# Altium schematic symbol library microbuilder.SCHLIB: 530 symbols (part 1 of 7)
Pins are listed as number, name and electrical type; pins without a type are passive.

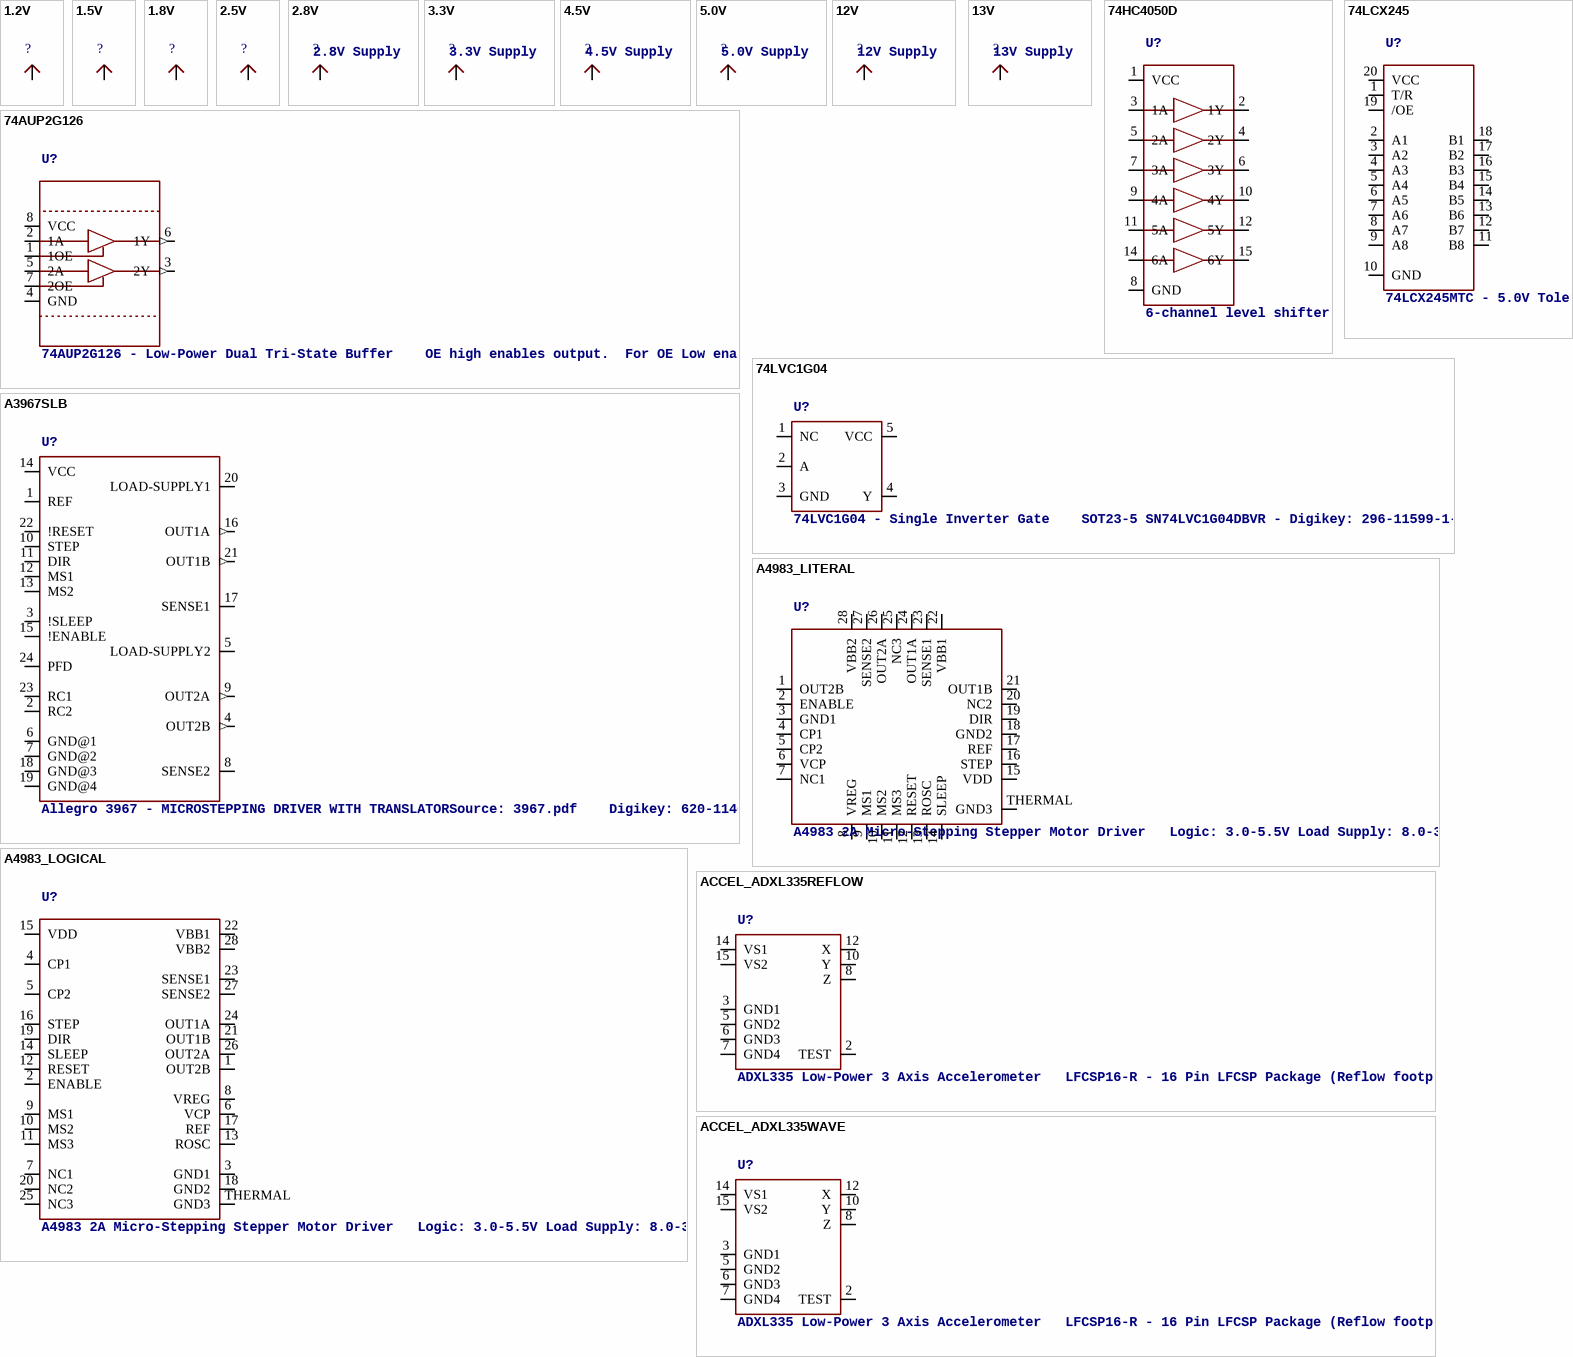
[diagram p0: symbols 1.2V to ACCEL_ADXL335WAVE]

## 1.2V
designator ?
pins: ?1 1.2V (oe)

## 1.5V
designator ?
pins: ?1 1.5V (oe)

## 1.8V
designator ?
pins: ?1 1.8V (oe)

## 2.5V
designator ?
pins: ?1 2.5V (oe)

## 2.8V
designator ?, comment 2.8V Supply
pins: ?1 2.8V (oe)

## 3.3V
designator ?, comment 3.3V Supply
pins: ?1 3.3V (oe)

## 4.5V
designator ?, comment 4.5V Supply
pins: ?1 4.5V (oe)

## 5.0V
designator ?, comment 5.0V Supply
pins: ?1 5.0V (oe)

## 12V
designator ?, comment 12V Supply
pins: ?1 12V (oe)

## 13V
designator ?, comment 13V Supply
pins: ?1 13V (oe)

## 74AUP2G126
designator U?, comment 74AUP2G126 - Low-Power Dual Tri-State Buffer    OE high enables output.  For OE Low enabled output use 74AUP2G125.    VCC: 0.8-3.6V  Temp: -40°C - 125°C       Package Variant: 8-VSSOP (SOT765-1)   Manuf. ID: 74AUP2G126DC,125   Digikey: 568-4987-1-ND   NOTE: Make sure to check the propogation delay to see if it's short enough for your timing since it's largely dependant on the line capacitance and supply voltage!
footprint VFSOP-8
pins: 1 1OE, 2 1A, 3 2Y (out), 4 GND (power), 5 2A, 6 1Y (out), 7 2OE, 8 VCC (power)

## 74HC4050D
designator U?, comment 6-channel level shifter    74HC4050D - 2V-6V Supply Digikey: 74HC4050D,653-ND  Mouser: 771-74HC4050D-T
footprint SOIC16
pins: 1 VCC, 2 1Y, 3 1A, 4 2Y, 5 2A, 6 3Y, 7 3A, 8 GND, 9 4A, 10 4Y, 11 5A, 12 5Y, 14 6A, 15 6Y

## 74LCX245
designator U?, comment 74LCX245MTC - 5.0V Tolerant Bi-Directional Buffer    Can be used to interface 5.0V logic to 2.5 or 3.3V devices Digikey: 74LCX245MTCXTR-ND  Mouser: 512-74LCX245MTCX
footprint TSSOP20
pins: 1 T/R, 2 A1, 3 A2, 4 A3, 5 A4, 6 A5, 7 A6, 8 A7, 9 A8, 10 GND, 11 B8, 12 B7, 13 B6, 14 B5, 15 B4, 16 B3, 17 B2, 18 B1, 19 /OE, 20 VCC

## 74LVC1G04
designator U?, comment 74LVC1G04 - Single Inverter Gate    SOT23-5 SN74LVC1G04DBVR - Digikey: 296-11599-1-ND
footprint SOT23-5
pins: 1 NC, 2 A, 3 GND (power), 4 Y, 5 VCC (power)

## A3967SLB
designator U?, comment Allegro 3967 - MICROSTEPPING DRIVER WITH TRANSLATORSource: 3967.pdf    Digikey: 620-1140-1-ND
footprint SOIC24WIDE
pins: 1 REF, 2 RC2, 3 !SLEEP, 4 OUT2B (out), 5 LOAD-SUPPLY2, 6 GND@1 (power), 7 GND@2 (power), 8 SENSE2, 9 OUT2A (out), 10 STEP, 11 DIR, 12 MS1, 13 MS2, 14 VCC (power), 15 !ENABLE, 16 OUT1A (out), 17 SENSE1, 18 GND@3 (power), 19 GND@4 (power), 20 LOAD-SUPPLY1, 21 OUT1B (out), 22 !RESET, 23 RC1, 24 PFD

## A4983_LITERAL
designator U?, comment A4983 2A Micro-Stepping Stepper Motor Driver   Logic: 3.0-5.5V Load Supply: 8.0-35V
footprint QFN28_5MM
pins: 1 OUT2B, 2 ENABLE, 3 GND1 (power), 4 CP1, 5 CP2, 6 VCP, 7 NC1, 8 VREG, 9 MS1, 10 MS2, 11 MS3, 12 RESET, 13 ROSC, 14 SLEEP, 15 VDD (power), 16 STEP, 17 REF, 18 GND2 (power), 19 DIR, 20 NC2, 21 OUT1B, 22 VBB1, 23 SENSE1, 24 OUT1A, 25 NC3, 26 OUT2A, 27 SENSE2, 28 VBB2, THERMAL GND3 (power)

## A4983_LOGICAL
designator U?, comment A4983 2A Micro-Stepping Stepper Motor Driver   Logic: 3.0-5.5V Load Supply: 8.0-35V
footprint QFN28_5MM
pins: 1 OUT2B, 2 ENABLE, 3 GND1 (power), 4 CP1, 5 CP2, 6 VCP, 7 NC1, 8 VREG, 9 MS1, 10 MS2, 11 MS3, 12 RESET, 13 ROSC, 14 SLEEP, 15 VDD (power), 16 STEP, 17 REF, 18 GND2 (power), 19 DIR, 20 NC2, 21 OUT1B, 22 VBB1, 23 SENSE1, 24 OUT1A, 25 NC3, 26 OUT2A, 27 SENSE2, 28 VBB2, THERMAL GND3 (power)

## ACCEL_ADXL335REFLOW
designator U?, comment ADXL335 Low-Power 3 Axis Accelerometer   LFCSP16-R - 16 Pin LFCSP Package (Reflow footprint) LFSCP16-W - 16 Pin LFCSP Package (Wave footprint with extended pads for hand soldering)    Digikey: ADXL335BCPZ-RL7CT-ND
footprint LFCSP16-R
pins: 2 TEST, 3 GND1, 5 GND2, 6 GND3, 7 GND4, 8 Z, 10 Y, 12 X, 14 VS1, 15 VS2

## ACCEL_ADXL335WAVE
designator U?, comment ADXL335 Low-Power 3 Axis Accelerometer   LFCSP16-R - 16 Pin LFCSP Package (Reflow footprint) LFSCP16-W - 16 Pin LFCSP Package (Wave footprint with extended pads for hand soldering)    Digikey: ADXL335BCPZ-RL7CT-ND
footprint LFCSP16-W
pins: 2 TEST, 3 GND1, 5 GND2, 6 GND3, 7 GND4, 8 Z, 10 Y, 12 X, 14 VS1, 15 VS2

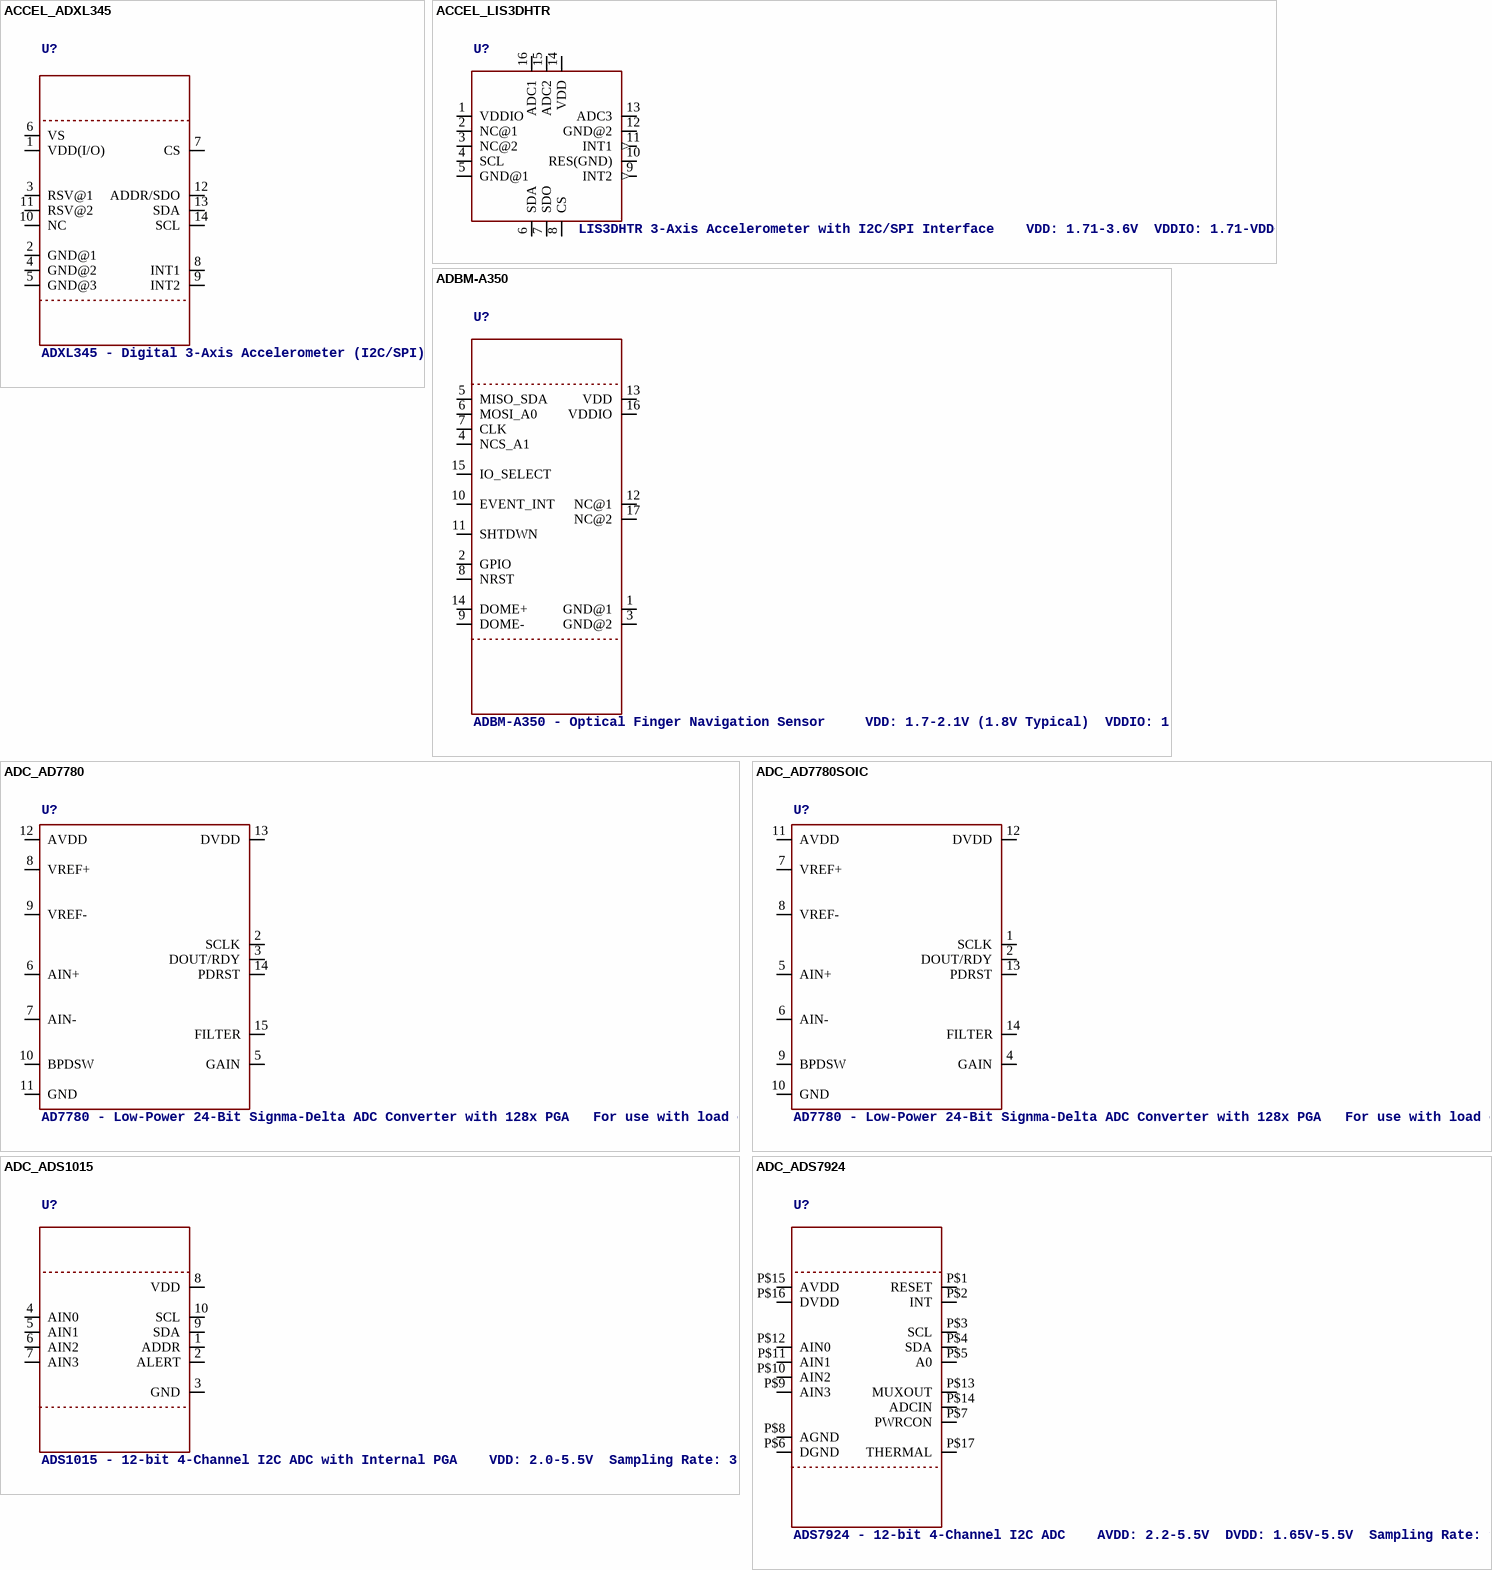
[diagram p1: symbols ACCEL_ADXL345 to ADC_ADS7924]

## ACCEL_ADXL345
designator U?, comment ADXL345 - Digital 3-Axis Accelerometer (I2C/SPI)
footprint LGA14
pins: 1 VDD(I/O), 2 GND@1, 3 RSV@1, 4 GND@2, 5 GND@3, 6 VS, 7 CS, 8 INT1, 9 INT2, 10 NC, 11 RSV@2, 12 ADDR/SDO, 13 SDA, 14 SCL

## ACCEL_LIS3DHTR
designator U?, comment LIS3DHTR 3-Axis Accelerometer with I2C/SPI Interface    VDD: 1.71-3.6V  VDDIO: 1.71-VDD+0.1V  Scale: +/-2g, 4g, 8g, 16g with 16--bit data output  Temp:: -40°C - 85°C       Mouser: 511-LIS3DHTR Digikey: 497-10613-1-ND
footprint LGA16_3X3MM
pins: 1 VDDIO (oe), 2 NC@1, 3 NC@2, 4 SCL, 5 GND@1 (oe), 6 SDA, 7 SDO, 8 CS, 9 INT2 (out), 10 RES(GND), 11 INT1 (out), 12 GND@2 (oe), 13 ADC3, 14 VDD (oe), 15 ADC2, 16 ADC1

## ADBM-A350
designator U?, comment ADBM-A350 - Optical Finger Navigation Sensor     VDD: 1.7-2.1V (1.8V Typical)  VDDIO: 1.65-3.6V (1.8V or 2.8V Typical)  Operating Temp: -20-70°C       FPC Connector: Hirose FH26-17S-0.3SHW(05)
footprint ADBM-A350
pins: 1 GND@1 (power), 2 GPIO, 3 GND@2 (power), 4 NCS_A1, 5 MISO_SDA, 6 MOSI_A0, 7 CLK, 8 NRST, 9 DOME-, 10 EVENT_INT, 11 SHTDWN, 12 NC@1, 13 VDD (power), 14 DOME+, 15 IO_SELECT, 16 VDDIO (power), 17 NC@2

## ADC_AD7780
designator U?, comment AD7780 - Low-Power 24-Bit Signma-Delta ADC Converter with 128x PGA   For use with load cells   TSSOP16 = 5.0x4.4mm package - Digikey: AD7780BRUZ-ND   SOIC14 = 8.70x3.9mm package - Digikey: AD7780BRZ-ND
footprint TSSOP16
pins: 2 SCLK, 3 DOUT/RDY, 5 GAIN, 6 AIN+, 7 AIN-, 8 VREF+, 9 VREF-, 10 BPDSW, 11 GND, 12 AVDD, 13 DVDD, 14 PDRST, 15 FILTER

## ADC_AD7780SOIC
designator U?, comment AD7780 - Low-Power 24-Bit Signma-Delta ADC Converter with 128x PGA   For use with load cells   TSSOP16 = 5.0x4.4mm package - Digikey: AD7780BRUZ-ND   SOIC14 = 8.70x3.9mm package - Digikey: AD7780BRZ-ND
footprint SOIC14
pins: 1 SCLK, 2 DOUT/RDY, 4 GAIN, 5 AIN+, 6 AIN-, 7 VREF+, 8 VREF-, 9 BPDSW, 10 GND, 11 AVDD, 12 DVDD, 13 PDRST, 14 FILTER

## ADC_ADS1015
designator U?, comment ADS1015 - 12-bit 4-Channel I2C ADC with Internal PGA    VDD: 2.0-5.5V  Sampling Rate: 3.3ksps  Gain Settings: 2/3, 1, 2, 4, 8, 16  I2C Address: ADDR low = 1001000x, ADDR high = 1001001x       Internal Comparator   The ADS1015 includes an internal comparator that can be set to output a high-level on ALERT when the conversion results exceeeds a pre-defined upper level, and will deassert itself when the level falls below a pre-defined lower threshold level. It can also be set to windowed mode where the ALERT pin will be asserted if the data exceeds the upper threshold or falls below the lower threshold.
footprint MSOP10
pins: 1 ADDR, 2 ALERT, 3 GND, 4 AIN0, 5 AIN1, 6 AIN2, 7 AIN3, 8 VDD, 9 SDA, 10 SCL

## ADC_ADS7924
designator U?, comment ADS7924 - 12-bit 4-Channel I2C ADC    AVDD: 2.2-5.5V  DVDD: 1.65V-5.5V  Sampling Rate: 100ksps  I2C Address: ADDR low = 1001000x, ADDR DVDD = 1001001x       Digital Threshold Comparators   The ADS794 is a relatively low-power device and can be useful in certain low-power scenarios since it can be configured to regularly check the voltage on the analog input pins, and throw an interrupt or pull an MCU out of reset when a specific condition is met.  Each of the four inputs has it's own programmable threshold level.  It could be used to monitor the input level of solar or other ambient energy sources, and when the level is sufficiently high, wakeup the MCU to perform read some sensor data, etc., or wait until a supercap is charged to a sufficiently high level before waking the MCU.
footprint WQFN16
pins: P$1 RESET, P$2 INT, P$3 SCL, P$4 SDA, P$5 A0, P$6 DGND, P$7 PWRCON, P$8 AGND, P$9 AIN3, P$10 AIN2, P$11 AIN1, P$12 AIN0, P$13 MUXOUT, P$14 ADCIN, P$15 AVDD, P$16 DVDD, P$17 THERMAL

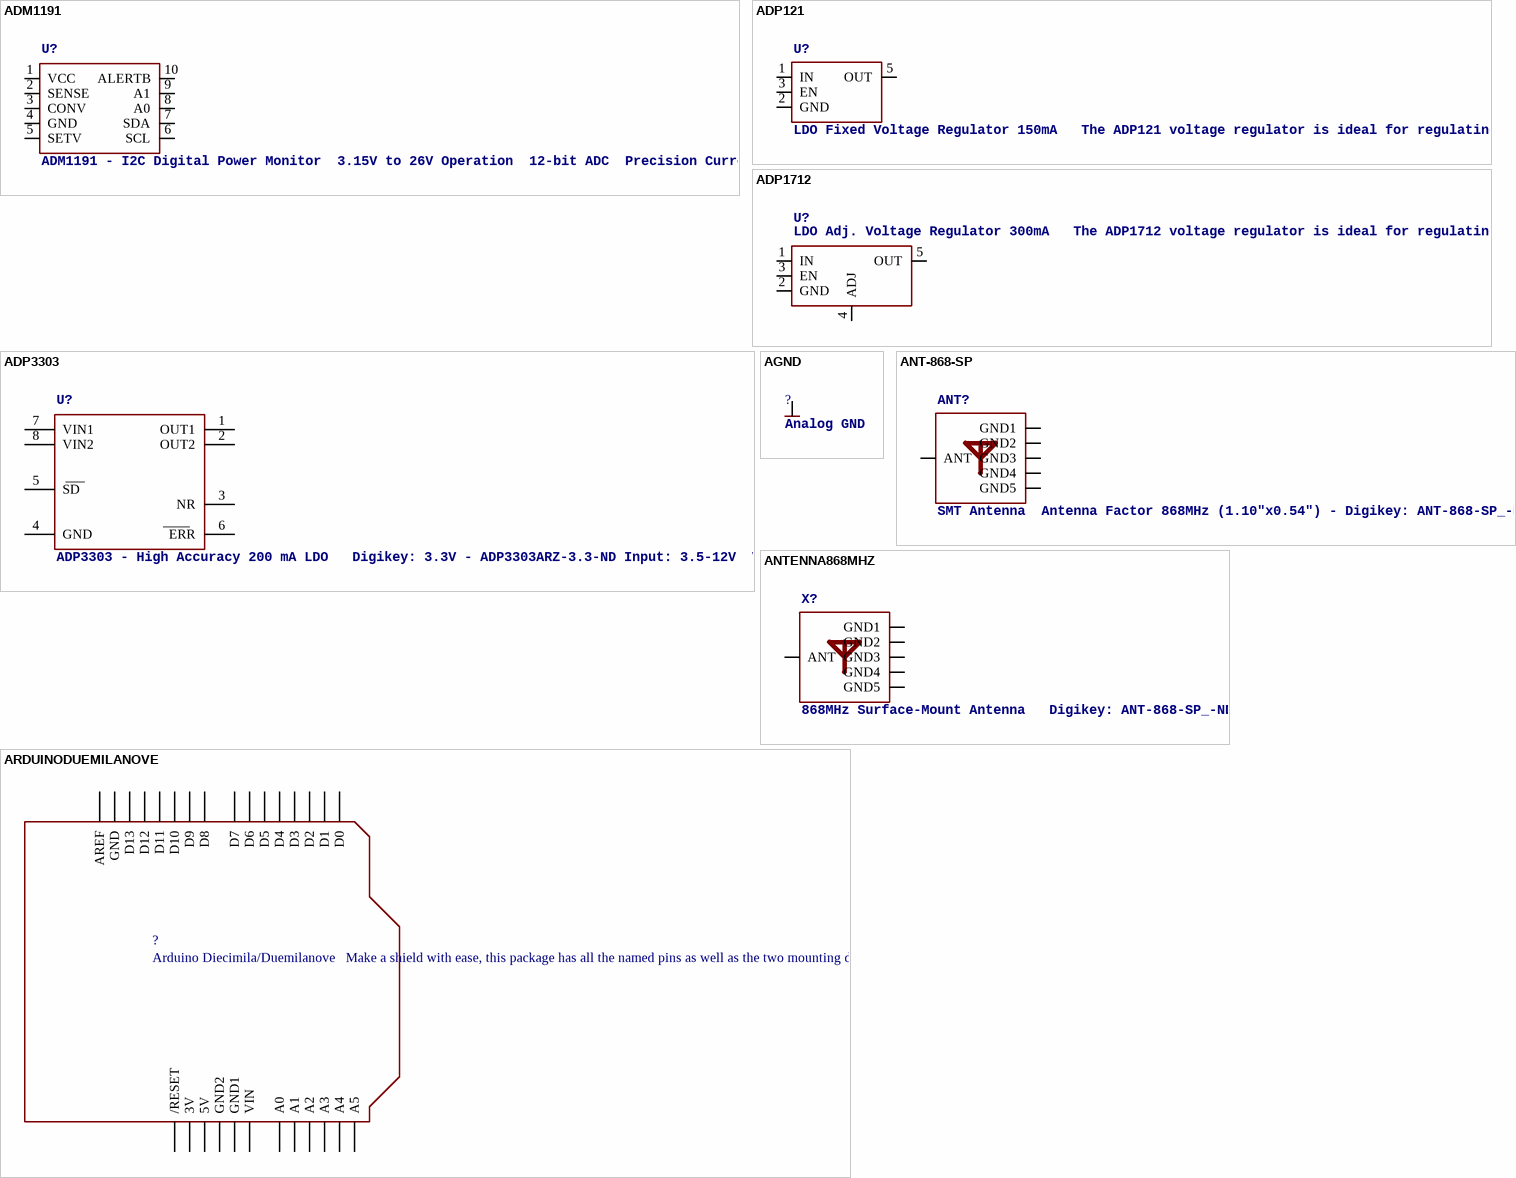
[diagram p2: symbols ADM1191 to ARDUINODUEMILANOVE]

## ADM1191
designator U?, comment ADM1191 - I2C Digital Power Monitor  3.15V to 26V Operation  12-bit ADC  Precision Current Sense Amplifier  Precision Voltage Input    Digikey: ADM1191-2ARMZ-R7TR-ND
footprint MSOP10
pins: 1 VCC, 2 SENSE, 3 CONV, 4 GND, 5 SETV, 6 SCL, 7 SDA, 8 A0, 9 A1, 10 ALERTB

## ADP121
designator U?, comment LDO Fixed Voltage Regulator 150mA   The ADP121 voltage regulator is ideal for regulating battery or solar power due to it's very low foreward voltage drop (maximum 90mV at 150mA).Forward Voltage Dropout: 90mV at 150mA Input Voltage Range: 2.3V-5.5V Output Voltage Range: 1.2V-3.3V (depending on model)  Digikey: 3.3V - ADP121-AUJZ33R7CT-ND  Digikey: 3.0V - ADP121-AUJZ30R7CT-ND
footprint SOT23-5
pins: 1 IN, 2 GND, 3 EN, 5 OUT

## ADP1712
designator U?, comment LDO Adj. Voltage Regulator 300mA   The ADP1712 voltage regulator is ideal for regulating battery or solar power due to it's very low foreward voltage drop (maximum 170mV at 300mA).Forward Voltage Dropout: 170mV at 300mA Input Voltage Range: 2.5V-5.5V Output Voltage Range: 0.8V-5.0V  1.2V - Digikey: ADP1712AUJZ-1.2-R7CT-ND  1.8V - Digikey: ADP1712AUJZ-1.8-R7CT-ND  3.3V - Digikey: ADP1712AUJZ-3.3-R7CT-ND
footprint SOT23-5
pins: 1 IN, 2 GND, 3 EN, 4 ADJ, 5 OUT

## ADP3303
designator U?, comment ADP3303 - High Accuracy 200 mA LDO   Digikey: 3.3V - ADP3303ARZ-3.3-ND Input: 3.5-12V  Vf: 180mV @ 200mA  Temp: -20°C-85°C       Digikey: 5.0V - ADP3303ARZ-5-ND
footprint SOIC8_150MIL
pins: 1 OUT1, 2 OUT2, 3 NR, 4 GND, 5 SD, 6 ERR, 7 VIN1, 8 VIN2

## AGND
designator ?, comment Analog GND
pins: ?1 AGND (oe)

## ANT-868-SP
designator ANT?, comment SMT Antenna  Antenna Factor 868MHz (1.10"x0.54") - Digikey: ANT-868-SP_-ND
footprint ANT_868MHZ_SPLATCH
pins: GND1 (power), GND2 (power), GND3 (power), GND4 (power), GND5 (power), MICROSTRIP ANT

## ANTENNA868MHZ
designator X?, comment 868MHz Surface-Mount Antenna   Digikey: ANT-868-SP_-ND
footprint 869MHZANTENNA
pins: P$1 ANT, P$2 GND1 (power), P$3 GND2 (power), P$4 GND3 (power), P$5 GND4 (power), P$6 GND5 (power)

## ARDUINODUEMILANOVE
designator ?, comment Arduino Diecimila/Duemilanove   Make a shield with ease, this package has all the named pins as well as the two mounting drill holes and an outline of the USB and DC power connector. The outline is on the DIMENSION layer, so if your board house uses it they will cut the outline to match.    http://www.ladyada.net/library/pcb/eaglelibrary.html
footprint ARDUINO
pins: 3V (power), 5V (power), A0, A1, A2, A3, A4, A5, AREF, D0, D1, D2, D3, D4, D5, D6, D7, D8, D9, D10, D11, D12, D13, GND (power), GND1 (power), GND2 (power), RESET /RESET, VIN (power)

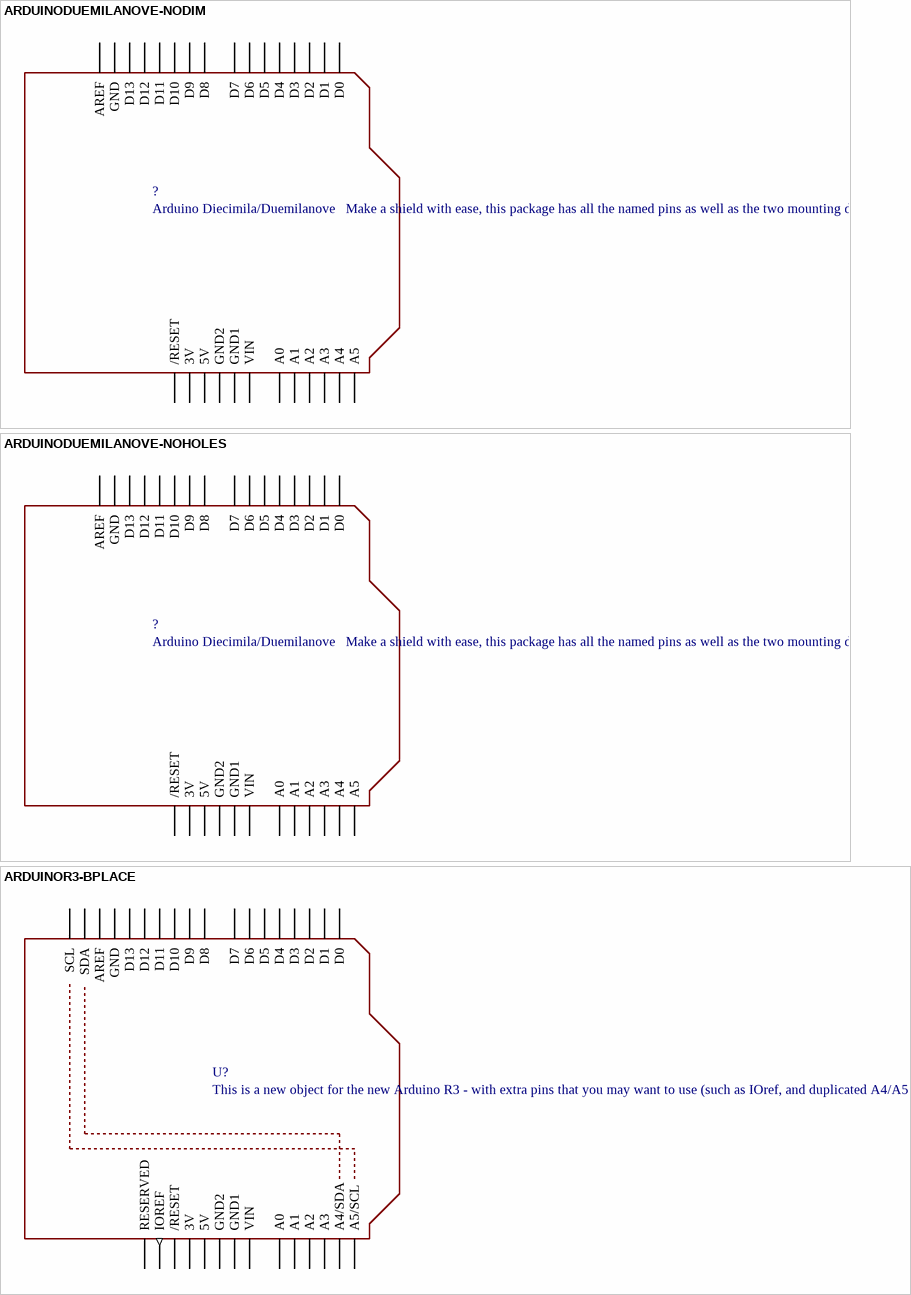
[diagram p3: symbols ARDUINODUEMILANOVE-NODIM to ARDUINOR3-BPLACE]

## ARDUINODUEMILANOVE-NODIM
designator ?, comment Arduino Diecimila/Duemilanove   Make a shield with ease, this package has all the named pins as well as the two mounting drill holes and an outline of the USB and DC power connector. The outline is on the DIMENSION layer, so if your board house uses it they will cut the outline to match.    http://www.ladyada.net/library/pcb/eaglelibrary.html
footprint ARDUINO-NODIM
pins: 3V (power), 5V (power), A0, A1, A2, A3, A4, A5, AREF, D0, D1, D2, D3, D4, D5, D6, D7, D8, D9, D10, D11, D12, D13, GND (power), GND1 (power), GND2 (power), RESET /RESET, VIN (power)

## ARDUINODUEMILANOVE-NOHOLES
designator ?, comment Arduino Diecimila/Duemilanove   Make a shield with ease, this package has all the named pins as well as the two mounting drill holes and an outline of the USB and DC power connector. The outline is on the DIMENSION layer, so if your board house uses it they will cut the outline to match.    http://www.ladyada.net/library/pcb/eaglelibrary.html
footprint ARDUINO-NOHOLE
pins: 3V (power), 5V (power), A0, A1, A2, A3, A4, A5, AREF, D0, D1, D2, D3, D4, D5, D6, D7, D8, D9, D10, D11, D12, D13, GND (power), GND1 (power), GND2 (power), RESET /RESET, VIN (power)

## ARDUINOR3-BPLACE
designator U?, comment This is a new object for the new Arduino R3 - with extra pins that you may want to use (such as IOref, and duplicated A4/A5
footprint ARDUINOR3-BPLACE
pins: 3V (power), 5V (power), A0, A1, A2, A3, A4 A4/SDA, A5 A5/SCL, AREF, D0, D1, D2, D3, D4, D5, D6, D7, D8, D9, D10, D11, D12, D13, GND (power), GND1 (power), GND2 (power), IOREF (out), RESERVED, RESET /RESET, SCL, SDA, VIN (power)

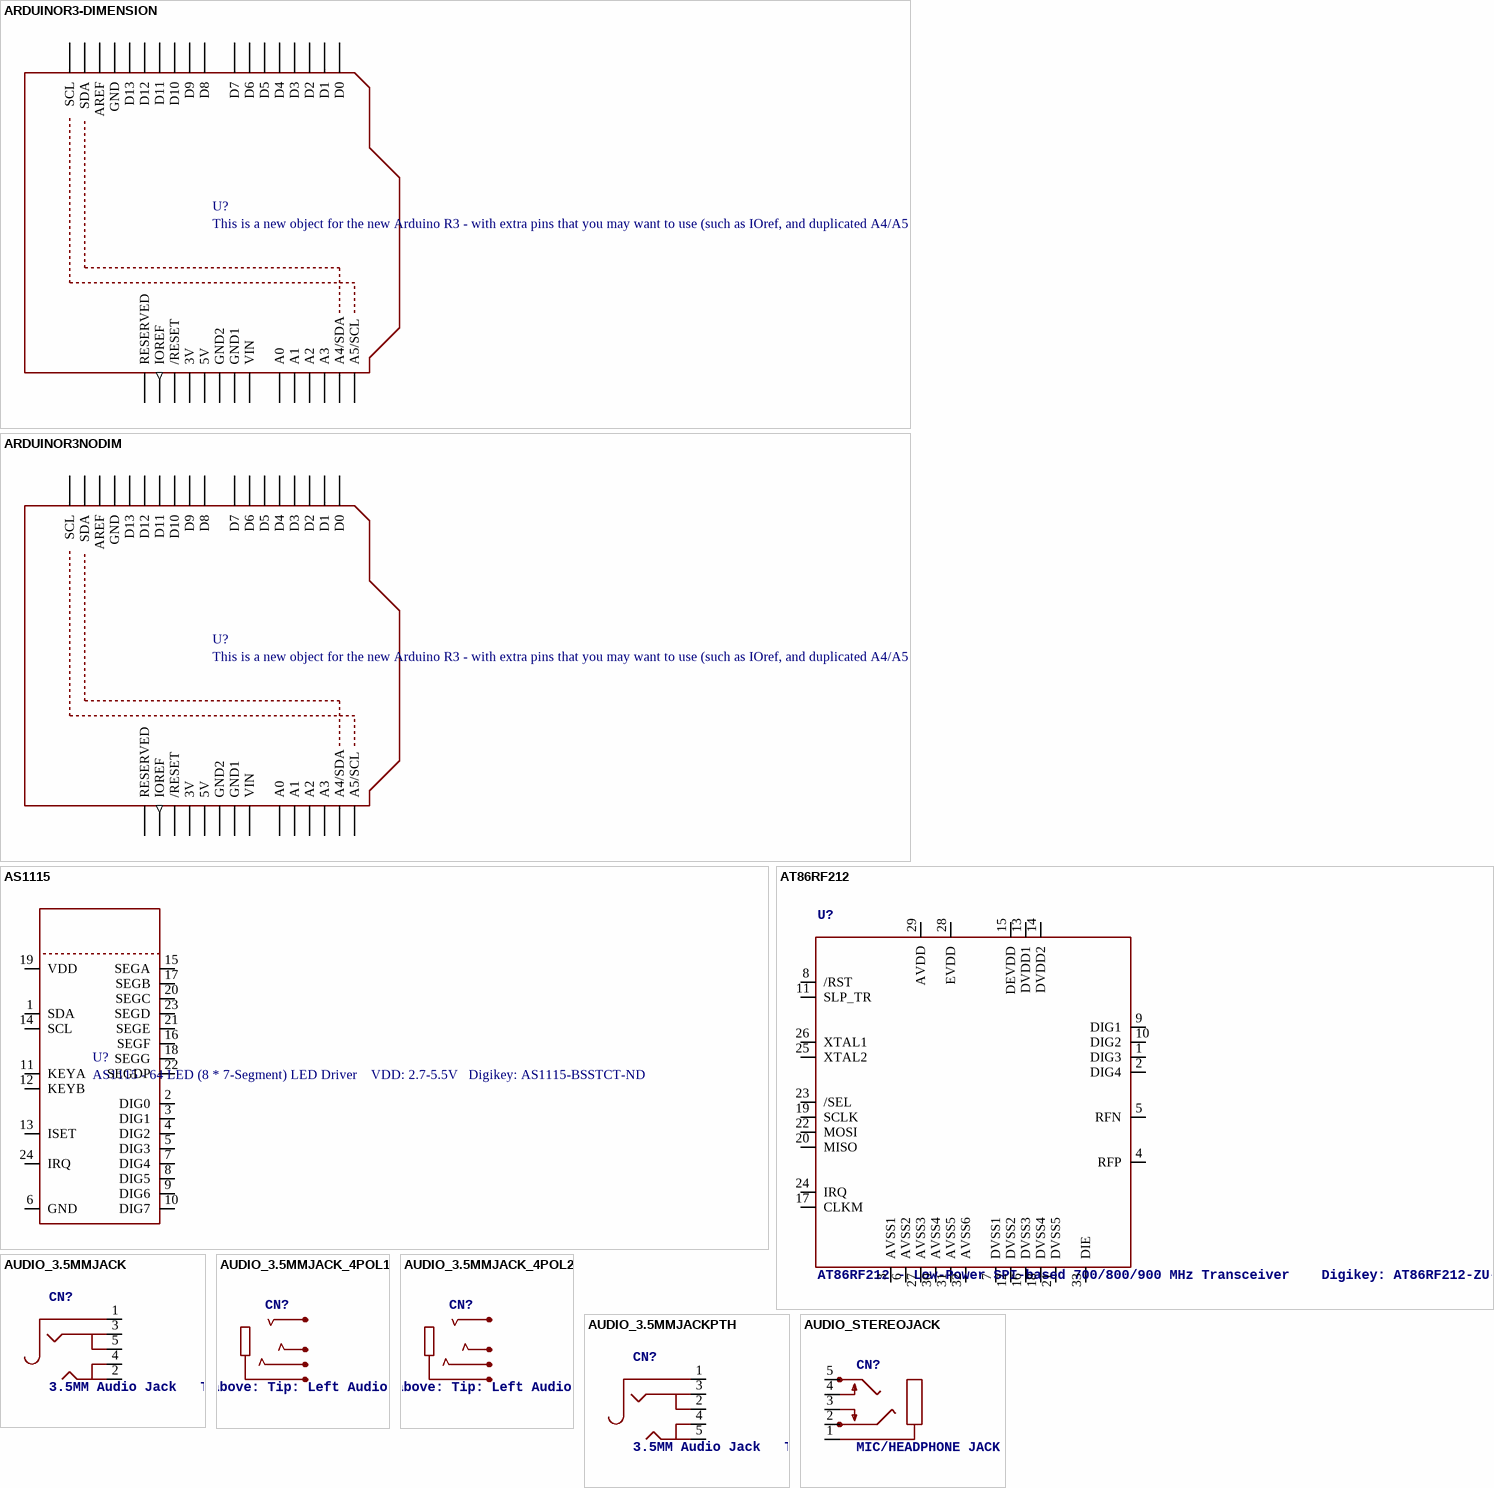
[diagram p4: symbols ARDUINOR3-DIMENSION to AUDIO_STEREOJACK]

## ARDUINOR3-DIMENSION
designator U?, comment This is a new object for the new Arduino R3 - with extra pins that you may want to use (such as IOref, and duplicated A4/A5
footprint ARDUINOR3
pins: 3V (power), 5V (power), A0, A1, A2, A3, A4 A4/SDA, A5 A5/SCL, AREF, D0, D1, D2, D3, D4, D5, D6, D7, D8, D9, D10, D11, D12, D13, GND (power), GND1 (power), GND2 (power), IOREF (out), RESERVED, RESET /RESET, SCL, SDA, VIN (power)

## ARDUINOR3NODIM
designator U?, comment This is a new object for the new Arduino R3 - with extra pins that you may want to use (such as IOref, and duplicated A4/A5
footprint ARDUINOR3-NODIM
pins: 3V (power), 5V (power), A0, A1, A2, A3, A4 A4/SDA, A5 A5/SCL, AREF, D0, D1, D2, D3, D4, D5, D6, D7, D8, D9, D10, D11, D12, D13, GND (power), GND1 (power), GND2 (power), IOREF (out), RESERVED, RESET /RESET, SCL, SDA, VIN (power)

## AS1115
designator U?, comment AS1115 - 64 LED (8 * 7-Segment) LED Driver    VDD: 2.7-5.5V   Digikey: AS1115-BSSTCT-ND
footprint QSOP24_0.635MM
pins: 1 SDA, 2 DIG0, 3 DIG1, 4 DIG2, 5 DIG3, 6 GND, 7 DIG4, 8 DIG5, 9 DIG6, 10 DIG7, 11 KEYA, 12 KEYB, 13 ISET, 14 SCL, 15 SEGA, 16 SEGF, 17 SEGB, 18 SEGG, 19 VDD, 20 SEGC, 21 SEGE, 22 SEGDP, 23 SEGD, 24 IRQ

## AT86RF212
designator U?, comment AT86RF212 - Low-Power SPI-based 700/800/900 MHz Transceiver    Digikey: AT86RF212-ZU-ND
PARTNO: AT86RF212-ZU
footprint 32QN2
pins: 1 DIG3, 2 DIG4, 3 AVSS1, 4 RFP, 5 RFN, 6 AVSS2, 7 DVSS1, 8 /RST, 9 DIG1, 10 DIG2, 11 SLP_TR, 12 DVSS2, 13 DVDD1, 14 DVDD2, 15 DEVDD, 16 DVSS3, 17 CLKM, 18 DVSS4, 19 SCLK, 20 MISO, 21 DVSS5, 22 MOSI, 23 /SEL, 24 IRQ, 25 XTAL2, 26 XTAL1, 27 AVSS3, 28 EVDD, 29 AVDD, 30 AVSS4, 31 AVSS5, 32 AVSS6, 33 DIE

## AUDIO_3.5MMJACK
designator CN?, comment 3.5MM Audio Jack   These are normally connected as follows, from left-to right on the schematic symbol above: Tip: Left Audio  Inner Ring: Right Audio  Shell: Common/GND
footprint 4UCONN_19269
pins: 1 P$1, 2 P$5, 3 P$2, 4 P$4, 5 P$3

## AUDIO_3.5MMJACK_4POL1
designator CN?, comment Footprint courtesy Morten Hjerde (Riftlabs.com)   These are normally connected as follows (4-pin 3.5mm 'TRRS'), from left-to right on the schematic symbol above: Tip: Left Audio  Outermost Ring: Right Audio  Innermost Ring: Common/GND  Shell: Mic+
footprint 4UCONN_19621_SPARK
pins: 1-GND GND, 2-TIP TIP, 3-OUTER_SLEEVE SLEEVE_OUTER, 4-INNER_SLEEVE SLEEVE_INNER

## AUDIO_3.5MMJACK_4POL2
designator CN?, comment Footprint courtesy Morten Hjerde (Riftlabs.com)   These are normally connected as follows (4-pin 3.5mm 'TRRS'), from left-to right on the schematic symbol above: Tip: Left Audio  Outermost Ring: Right Audio  Innermost Ring: Common/GND  Shell: Mic+
footprint 4UCONN_19621
pins: 1-GND GND, 2-TIP TIP, 3-OUTER_SLEEVE SLEEVE_OUTER, 4-INNER_SLEEVE SLEEVE_INNER

## AUDIO_3.5MMJACKPTH
designator CN?, comment 3.5MM Audio Jack   These are normally connected as follows, from left-to right on the schematic symbol above: Tip: Left Audio  Inner Ring: Right Audio  Shell: Common/GND
footprint 4UCONN_05550
pins: 1 P$1, 2 P$3, 3 P$2, 4 P$4, 5 P$5

## AUDIO_STEREOJACK
designator CN?, comment MIC/HEADPHONE JACK   Stereo jack with two switches. Kycon STX3100, CUI SJ1-3555NG and/or 4UCon 05544    Digikey: CP1-3555NG-ND   Shamelessly taken from the Adafruit Eagle library (public domain) ... thanks!   These are normally connected as follows, from right-to-left on the schematic symbol above: Tip: Left Audio  Inner Ring: Right Audio  Shell: Common/GND
footprint STX3100
pins: 1, 2, 3, 4, 5

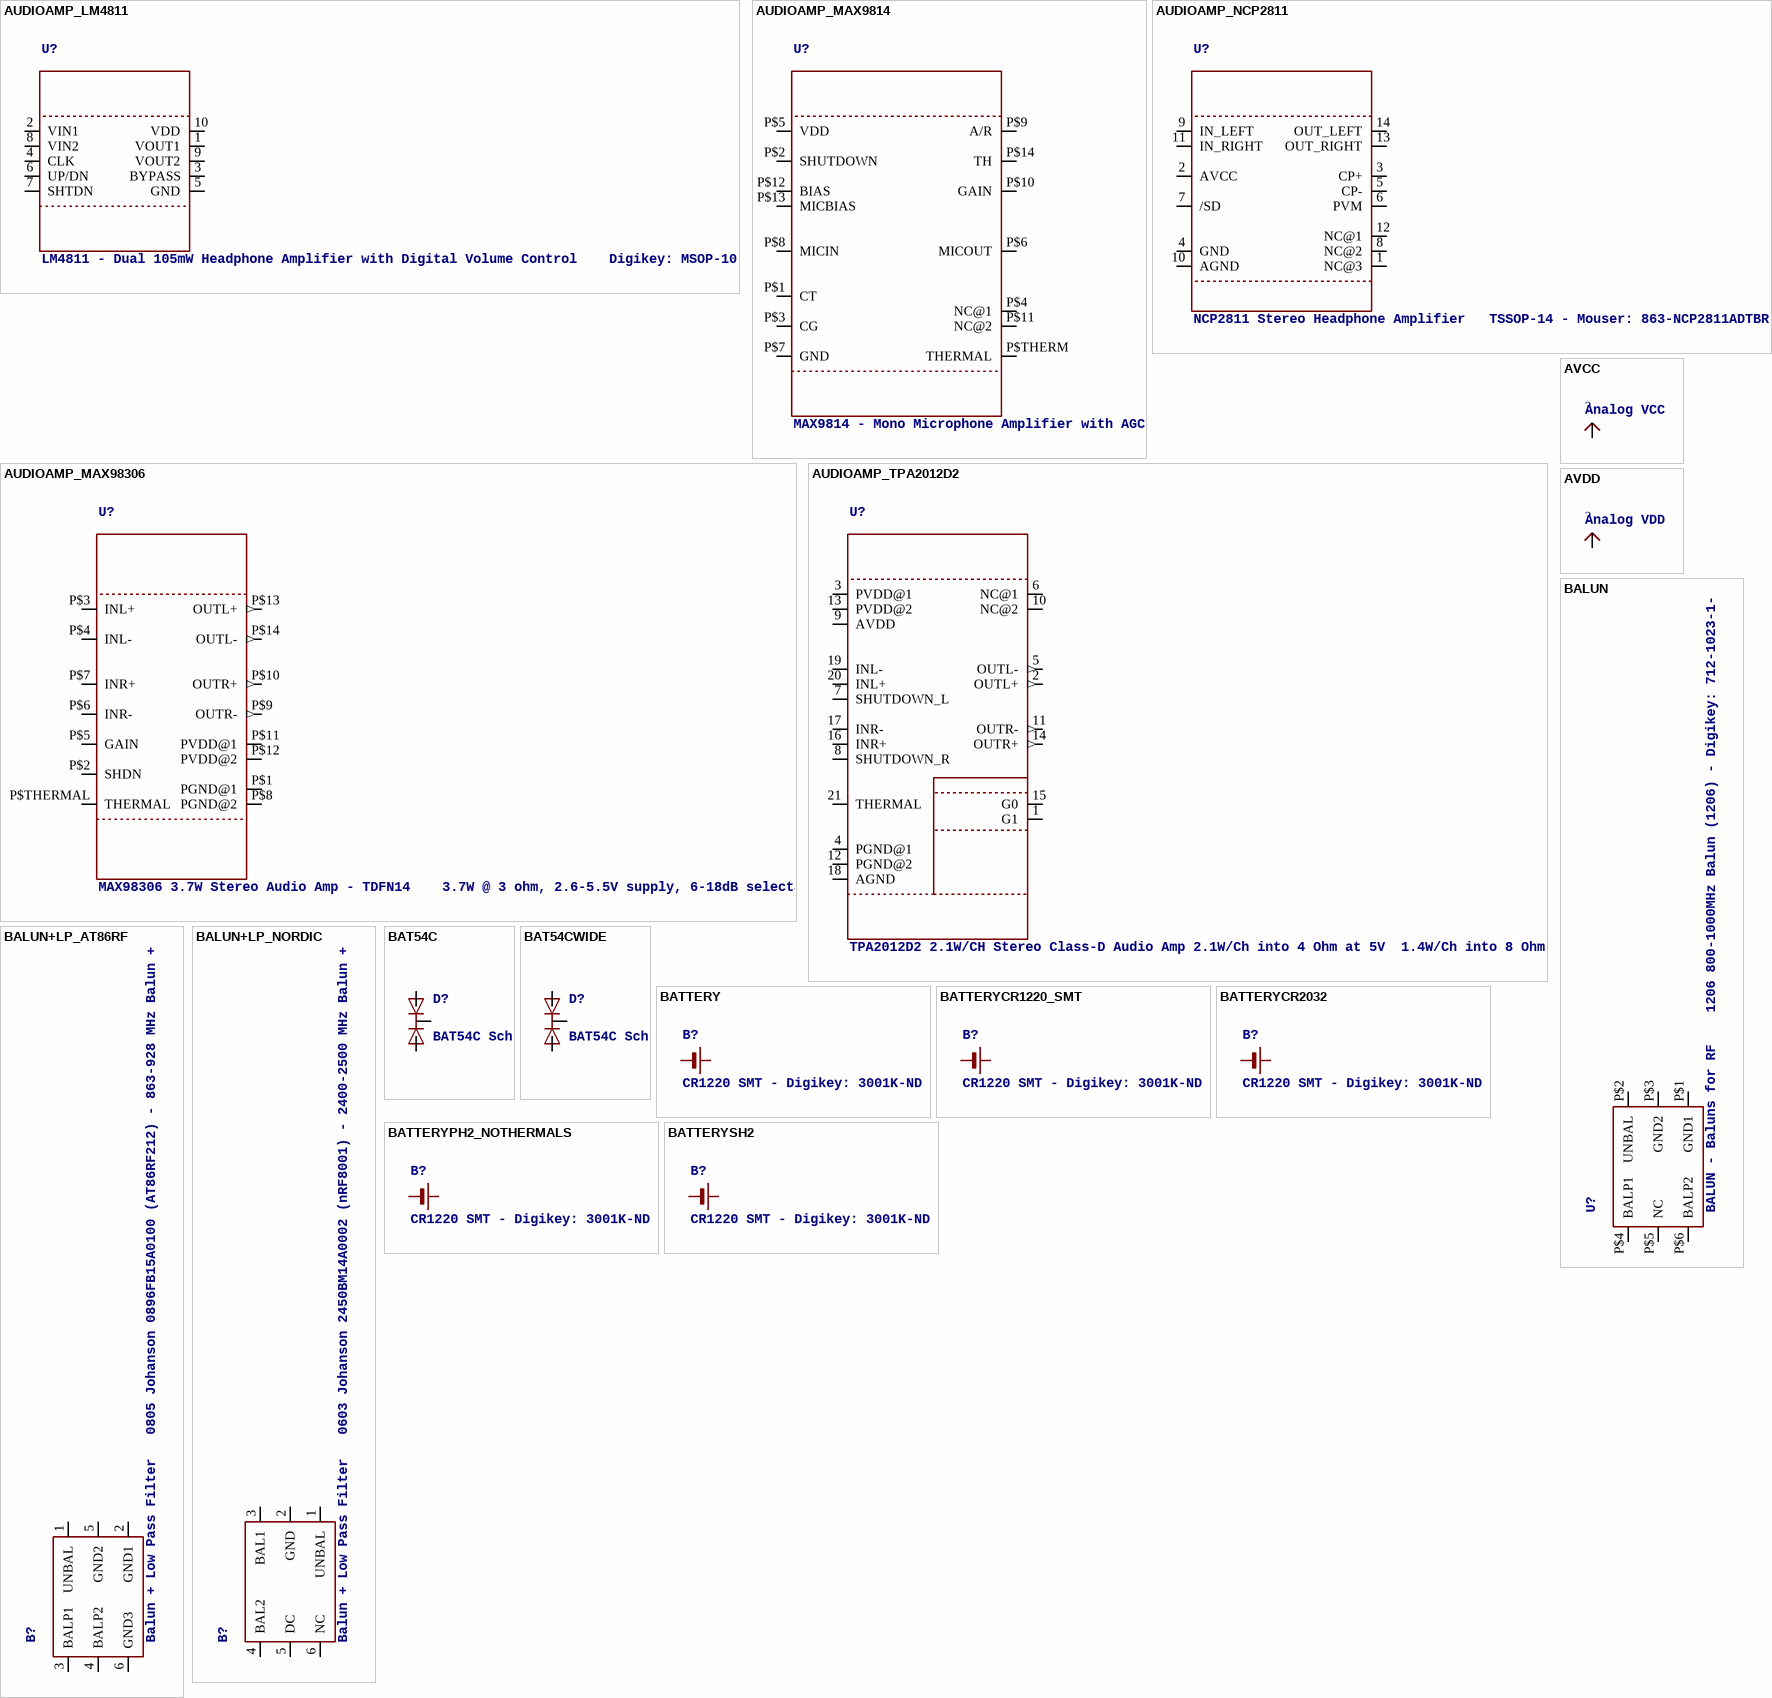
[diagram p5: symbols AUDIOAMP_LM4811 to BATTERYSH2]

## AUDIOAMP_LM4811
designator U?, comment LM4811 - Dual 105mW Headphone Amplifier with Digital Volume Control    Digikey: MSOP-10 - LM4811MMCT-ND
footprint MSOP10
pins: 1 VOUT1, 2 VIN1, 3 BYPASS, 4 CLK, 5 GND, 6 UP/DN, 7 SHTDN, 8 VIN2, 9 VOUT2, 10 VDD

## AUDIOAMP_MAX9814
designator U?, comment MAX9814 - Mono Microphone Amplifier with AGC
footprint WFDFN-14
pins: P$1 CT, P$2 SHUTDOWN, P$3 CG, P$4 NC@1, P$5 VDD, P$6 MICOUT, P$7 GND, P$8 MICIN, P$9 A/R, P$10 GAIN, P$11 NC@2, P$12 BIAS, P$13 MICBIAS, P$14 TH, P$THERM THERMAL

## AUDIOAMP_MAX98306
designator U?, comment MAX98306 3.7W Stereo Audio Amp - TDFN14    3.7W @ 3 ohm, 2.6-5.5V supply, 6-18dB selectable gain
footprint TDFN14_3X3MM
pins: P$1 PGND@1 (power), P$2 SHDN, P$3 INL+, P$4 INL-, P$5 GAIN, P$6 INR-, P$7 INR+, P$8 PGND@2 (power), P$9 OUTR- (out), P$10 OUTR+ (out), P$11 PVDD@1 (power), P$12 PVDD@2 (power), P$13 OUTL+ (out), P$14 OUTL- (out), P$THERMAL THERMAL (power)

## AUDIOAMP_NCP2811
designator U?, comment NCP2811 Stereo Headphone Amplifier   TSSOP-14 - Mouser: 863-NCP2811ADTBR2G
footprint TSSOP14
pins: 1 NC@3, 2 AVCC, 3 CP+, 4 GND, 5 CP-, 6 PVM, 7 /SD, 8 NC@2, 9 IN_LEFT, 10 AGND, 11 IN_RIGHT, 12 NC@1, 13 OUT_RIGHT, 14 OUT_LEFT
